# Altium footprint library Elettronica FM.PcbLib: 387 footprints (part 19 of 25)
Each footprint in its own frame and in the unit in brackets; x right, y up, seen from the top. Pads: shape width x height; smd on the part's side, far side on the other; paste and mask are expansions set on the pad; w line width, h text height; cw(c..) or ccw(c..) is an arc to the next point about the centre after c.
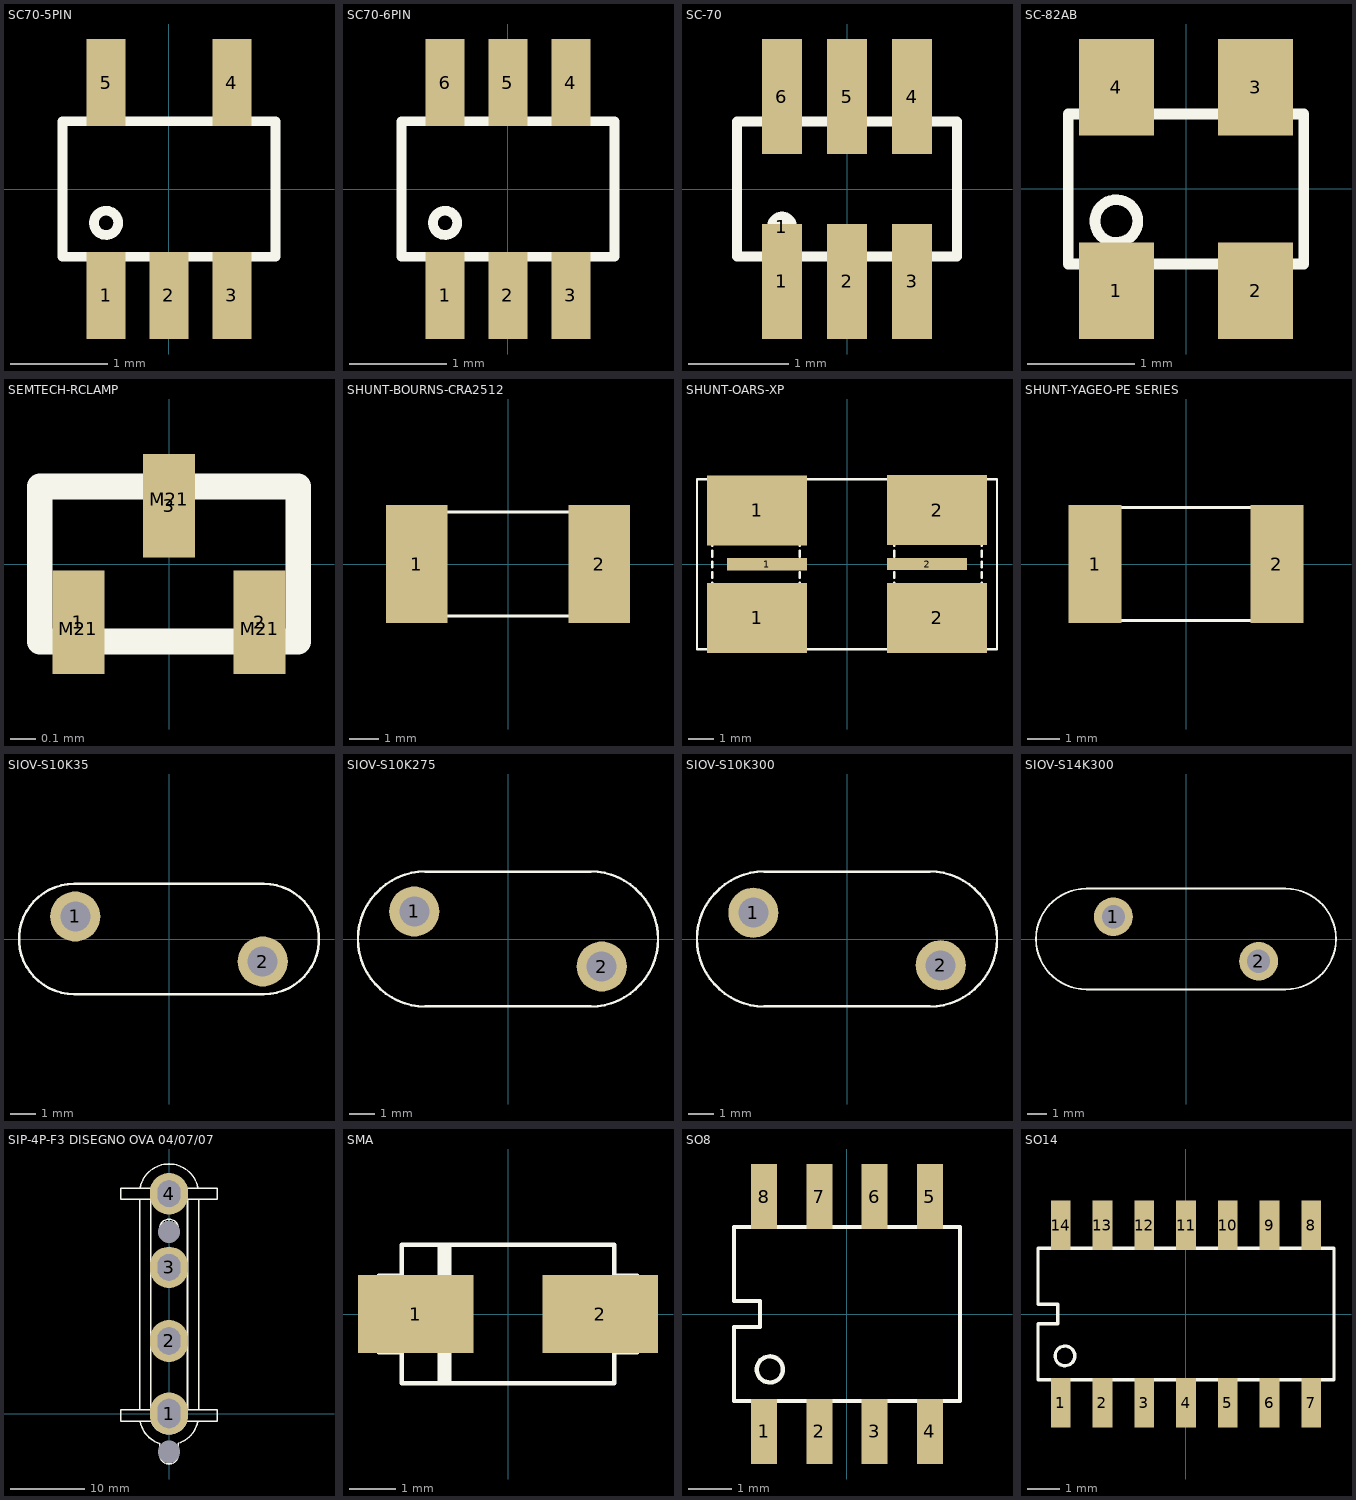
[diagram p18: the footprints below, top view; thin cyan lines are the x and y axes]

## SC70-5PIN [mm]
height 1.7
pads (5):
  rect 0.4x0.9 smd paste-1: 1(-0.65,-1.1) 2(0,-1.1) 3(0.65,-1.1) 4(0.65,1.1) 5(-0.65,1.1)
Top Overlay:
  circle w0.1: c-0.65,-0.35 r0.125
  lines w0.1: -1.1,-0.7 -1.1,0.7 1.1,0.7 1.1,-0.7 -1.1,-0.7
Top Paste:
  region: 0.475,-0.675 0.475,-1.525 0.825,-1.525 0.825,-0.675
  region: -0.175,-0.675 -0.175,-1.525 0.175,-1.525 0.175,-0.675
  region: -0.825,-0.675 -0.825,-1.525 -0.475,-1.525 -0.475,-0.675
  region: 0.475,1.525 0.475,0.675 0.825,0.675 0.825,1.525
  region: -0.825,1.525 -0.825,0.675 -0.475,0.675 -0.475,1.525
3D body "SC70-6 (SOT363).stp": height 0.95, standoff 0, extent -1,-1.05 1,1.05

## SC70-6PIN [mm]
height 1.7
pads (6):
  rect 0.4x0.9 smd paste-1: 1(-0.65,-1.1) 2(0,-1.1) 3(0.65,-1.1) 4(0.65,1.1) 5(0,1.1) 6(-0.65,1.1)
Top Overlay:
  circle w0.1: c-0.65,-0.35 r0.125
  lines w0.1: -1.1,-0.7 1.1,-0.7 1.1,0.7 -1.1,0.7 -1.1,-0.7
Top Paste:
  region: -0.825,1.525 -0.825,0.675 -0.475,0.675 -0.475,1.525
  region: -0.175,1.525 -0.175,0.675 0.175,0.675 0.175,1.525
  region: 0.475,1.525 0.475,0.675 0.825,0.675 0.825,1.525
  region: -0.825,-0.675 -0.825,-1.525 -0.475,-1.525 -0.475,-0.675
  region: -0.175,-0.675 -0.175,-1.525 0.175,-1.525 0.175,-0.675
  region: 0.475,-0.675 0.475,-1.525 0.825,-1.525 0.825,-0.675
3D body "SC70-6 (SOT363).stp": height 0.95, standoff 0, extent -1,-1.05 1,1.05

## SC-70 [mm]
height 1.9
pads (7):
  rect 0.4x1.15 smd mask+0.075: 1(-0.65,-0.925) 2(0,-0.925) 3(0.65,-0.925) 4(0.65,0.925) 5(0,0.925) 6(-0.65,0.925)
  round 0.3 on Top Overlay mask+0.1: 1(-0.65,-0.375)
Top Overlay:
  lines w0.1: -1.1,-0.675 1.1,-0.675 1.1,0.675 -1.1,0.675 -1.1,-0.675

## SC-82AB [mm]
height 1.7
pads (4):
  rect 0.7x0.9 smd: 1(-0.65,-0.95) 2(0.65,-0.95) 3(0.65,0.95) 4(-0.65,0.95)
Top Overlay:
  circle w0.1: c-0.65,-0.3 r0.2
  lines w0.1: -1.1,-0.7 1.1,-0.7 1.1,0.7 -1.1,0.7 -1.1,-0.7

## SEMTECH-RCLAMP [mm]
height 1.9
pads (6):
  rect 0.2x0.4 smd paste-5 mask+0.05: 1(-0.35,-0.225) 2(0.35,-0.225) 3(0,0.225)
  rect 0.22x0.46 on Top Paste paste+0 mask+0.05: M21(-0.35,-0.25) M21(0,0.25) M21(0.35,-0.25)
Top Overlay:
  lines w0.1: -0.5,-0.3 0.5,-0.3 0.5,0.3 -0.5,0.3 -0.5,-0.3
3D body: height 0.4, standoff 0, extent -0.5,-0.3 0.5,0.3

## SHUNT-BOURNS-CRA2512 [mm]
pads (2):
  rect 2.1x4 smd: 1(-3.1,0) 2(3.1,0)
Top Overlay:
  lines w0.1: -2.275,-1.775 -2.275,1.775 ; 2.275,-1.775 2.275,1.775 ; -3.325,-1.775 -3.325,1.775 3.325,1.775 3.325,-1.775 -3.325,-1.775

## SHUNT-OARS-XP [mm]
height 14.2
pads (6):
  rect 4x2.8 smd mask+0.075: 1(-3.6,2.15) 1(-3.6,-2.15) 2(3.6,-2.15) 2(3.6,2.15)
  rect 3.2x0.5 smd mask+0.075: 1(-3.2,0) 2(3.2,0)
Top Overlay:
  lines w0.1: -5.4,-3.4 -5.4,-3.3 ; -5.4,-3.1 -5.4,-2.875 ; -5.4,-2.675 -5.4,-2.45 ; -5.4,-2.25 -5.4,-2.025 ; -5.4,-1.825 -5.4,-1.6 ; -5.4,-1.4 -5.4,-1.175 ; -5.4,-0.975 -5.4,-0.75 ; -5.4,-0.55 -5.4,-0.325 ; -5.4,-0.125 -5.4,0.1 ; -5.4,0.3 -5.4,0.525 ; -5.4,0.725 -5.4,0.95 ; -5.4,1.15 -5.4,1.375 ; -5.4,1.575 -5.4,1.8 ; -5.4,2 -5.4,2.225 ; -5.4,2.425 -5.4,2.65 ; -5.4,2.85 -5.4,3.075 ; -5.4,3.275 -5.4,3.4 ; -1.9,-3.4 -1.9,-3.3 ; -1.9,-3.1 -1.9,-2.875 ; -1.9,-2.675 -1.9,-2.45 ; -1.9,-2.25 -1.9,-2.025 ; -1.9,-1.825 -1.9,-1.6 ; -1.9,-1.4 -1.9,-1.175 ; -1.9,-0.975 -1.9,-0.75 ; -1.9,-0.55 -1.9,-0.325 ; -1.9,-0.125 -1.9,0.1 ; -1.9,0.3 -1.9,0.525 ; -1.9,0.725 -1.9,0.95 ; -1.9,1.15 -1.9,1.375 ; -1.9,1.575 -1.9,1.8 ; -1.9,2 -1.9,2.225 ; -1.9,2.425 -1.9,2.65 ; -1.9,2.85 -1.9,3.075 ; -1.9,3.275 -1.9,3.4 ; 1.9,-3.4 1.9,-3.3 ; 1.9,-3.1 1.9,-2.875 ; 1.9,-2.675 1.9,-2.45 ; 1.9,-2.25 1.9,-2.025 ; 1.9,-1.825 1.9,-1.6 ; 1.9,-1.4 1.9,-1.175 ; 1.9,-0.975 1.9,-0.75 ; 1.9,-0.55 1.9,-0.325 ; 1.9,-0.125 1.9,0.1 ; 1.9,0.3 1.9,0.525 ; 1.9,0.725 1.9,0.95 ; 1.9,1.15 1.9,1.375 ; 1.9,1.575 1.9,1.8 ; 1.9,2 1.9,2.225 ; 1.9,2.425 1.9,2.65 ; 1.9,2.85 1.9,3.075 ; 1.9,3.275 1.9,3.4 ; 5.4,-3.4 5.4,-3.3 ; 5.4,-3.1 5.4,-2.875 ; 5.4,-2.675 5.4,-2.45 ; 5.4,-2.25 5.4,-2.025 ; 5.4,-1.825 5.4,-1.6 ; 5.4,-1.4 5.4,-1.175 ; 5.4,-0.975 5.4,-0.75 ; 5.4,-0.55 5.4,-0.325 ; 5.4,-0.125 5.4,0.1 ; 5.4,0.3 5.4,0.525 ; 5.4,0.725 5.4,0.95 ; 5.4,1.15 5.4,1.375 ; 5.4,1.575 5.4,1.8 ; 5.4,2 5.4,2.225 ; 5.4,2.425 5.4,2.65 ; 5.4,2.85 5.4,3.075 ; 5.4,3.275 5.4,3.4 ; -6,-3.4 6,-3.4 6,3.4 -6,3.4 -6,-3.4
3D body: height 4.6, standoff 0, extent -6,-3.4 6,3.4

## SHUNT-YAGEO-PE SERIES [mm]
pads (2):
  rect 1.65x3.7 smd: 1(-2.85,0) 2(2.85,0)
Top Overlay:
  lines w0.1: -2.275,-1.775 -2.275,1.775 ; 2.275,-1.775 2.275,1.775 ; -3.325,-1.775 3.325,-1.775 3.325,1.775 -3.325,1.775 -3.325,-1.775

## SIOV-S10K35 [mm]
pads (2):
  round 2 hole 1.2 mask+0.101: 1(-3.75,0.9) 2(3.75,-0.9)
Top Overlay:
  lines w0.1: -3.8,-2.2 cw(c-3.8,0) -3.8,2.2 3.8,2.2 cw(c3.8,0) 3.8,-2.2 -3.8,-2.2
3D body: height 14.5, standoff 2.5, extent -6,-2.2 6,2.2
3D body: height 5, standoff 0, extent 2.95,-1.699 4.55,-0.1
3D body: height 5, standoff 0, extent -4.55,0.101 -2.95,1.7
3D body: height 1.9, standoff -3.1, extent -4.15,0.5 -3.35,1.3
3D body: height 1.9, standoff -3.1, extent 3.35,-1.3 4.15,-0.5

## SIOV-S10K275 [mm]
pads (2):
  round 2 hole 1.2 mask+0.101: 1(-3.75,1.1) 2(3.75,-1.1)
Top Overlay:
  lines w0.1: -3.3,-2.7 cw(c-3.3,0) -3.3,2.7 3.3,2.7 cw(c3.3,0) 3.3,-2.7 -3.3,-2.7
3D body: height 1.9, standoff -3.1, extent 3.35,-1.5 4.15,-0.7
3D body: height 1.9, standoff -3.1, extent -4.15,0.7 -3.35,1.5
3D body: height 5, standoff 0, extent -4.55,0.301 -2.95,1.9
3D body: height 5, standoff 0, extent 2.95,-1.899 4.55,-0.3
3D body: height 15, standoff 3, extent -6,-2.7 6,2.7

## SIOV-S10K300 [mm]
pads (2):
  round 2 hole 1.2 mask+0.101: 1(-3.75,1.05) 2(3.75,-1.05)
Top Overlay:
  lines w0.1: -3.3,-2.7 cw(c-3.3,0) -3.3,2.7 3.3,2.7 cw(c3.3,0) 3.3,-2.7 -3.3,-2.7
3D body: height 1.9, standoff -3.1, extent 3.35,-1.45 4.15,-0.65
3D body: height 1.9, standoff -3.1, extent -4.15,0.65 -3.35,1.45
3D body: height 5, standoff 0, extent -4.55,0.251 -2.95,1.85
3D body: height 5, standoff 0, extent 2.95,-1.849 4.55,-0.25
3D body: height 15, standoff 3, extent -6,-2.7 6,2.7

## SIOV-S14K300 [mm]
pads (2):
  round 2 hole 1.2 mask+0.101: 1(-3.75,1.15) 2(3.75,-1.15)
Top Overlay:
  lines w0.1: -5.15,-2.6 cw(c-5.15,0) -5.15,2.6 5.15,2.6 cw(c5.15,0) 5.15,-2.6 -5.15,-2.6
3D body: height 1.9, standoff -3.1, extent 3.35,-1.55 4.15,-0.75
3D body: height 1.9, standoff -3.1, extent -4.15,0.75 -3.35,1.55
3D body: height 5, standoff 0, extent -4.55,0.351 -2.95,1.95
3D body: height 5, standoff 0, extent 2.95,-1.949 4.55,-0.35
3D body: height 18.5, standoff 3, extent -7.75,-2.6 7.75,2.6

## SIP-4P-F3 DISEGNO OVA 04/07/07 [mm]
pads (6):
  oval 5.2x5.7 hole 3.1 slot 4 at 90 deg: 1(0,0)
  oval 5.2x5.7 hole 3.1 slot 3.7 at 90 deg: 2(0,9.8)
  oval 5.2x5.6 hole 3.1 slot 3.6 at 90 deg: 3(0,19.75) 4(0,29.71)
  round 0 hole 3 unplated: 5(0,24.54) 6(0,-5.18)
Top Overlay:
  circle w0.203: c0,29.725 r2
  circle w0.203: c0,19.725 r2
  circle w0.203: c0,9.725 r2
  circle w0.203: c0,-0.275 r2
  circle w0.203: c0.001,-5.576 r0.384
  circle w0.203: c0.001,25.026 r0.384
  lines w0.203: -3.969,0.475 -3.969,28.975 ; -3.912,-1.108 ccw(c0.001,-0.276) -1.248,-4.076 ; -3.912,30.557 cw(c0.001,29.725) 3.914,30.557 ; -2.499,0.475 -2.499,28.975 ; -2.35,30.579 cw(c-0.001,29.724) 2.348,30.579 ; -2.348,-1.129 ccw(c0.001,-0.274) 2.35,-1.129 ; -1.88,0.475 -6.5,0.475 -6.5,-1.025 -1.829,-1.025 ; -1.88,30.475 -6.5,30.475 -6.5,28.975 -1.829,28.975 ; -1.249,-4.043 -1.249,-4.075 -1.249,-5.276 ccw(c0.001,-5.276) -1.246,-5.361 ; -1.246,-5.36 -1.246,-5.36 ; 1.829,0.475 6.5,0.475 6.5,-1.025 1.88,-1.025 ; 1.829,30.475 6.5,30.475 6.5,28.975 1.88,28.975 ; 2.501,0.475 2.501,28.975 ; 3.914,-1.075 cw(c0.001,-0.243) 1.25,-4.043 ; 4.001,0.475 4.001,28.975 ; -1.246,-5.361 ccw(c0.005,-5.275) -1.24,-5.426 ; -1.24,-5.426 cw(c0.001,-5.576) 1.242,-5.426 ; -1.24,-5.426 ccw(c0.001,-5.576) 1.242,-5.426 ; -1.24,-5.426 ccw(c0.001,-5.276) 1.242,-5.426 ; -1.24,-5.426 -1.24,-5.426 ; -1.24,24.876 ccw(c0.001,25.027) 1.242,24.876 ; -1.24,24.876 cw(c0.001,24.726) 1.242,24.876 ; -1.24,24.876 cw(c0.001,24.726) 1.242,24.876 ; -1.24,24.876 cw(c0.001,25.026) 1.242,24.876 ; -1.24,24.876 -1.24,24.876 ; 1.242,-5.426 ccw(c0.001,-5.276) 1.251,-5.276 ; 1.242,-5.426 1.242,-5.426 ; 1.242,24.876 1.242,24.876 ; 1.251,-5.276 1.251,-4.075 1.251,-4.043 ; 1.251,-5.275 1.251,-4.043

## SMA [mm]
height 1.9
pads (2):
  rect 2.5x1.7 smd: 1(-2,0) 2(2,0)
Top Overlay:
  lines w0.1: -2.3,-0.825 -2.8,-0.825 -2.8,0.825 -2.3,0.825 ; -1.475,-1.5 -1.475,1.5 ; -1.375,-1.5 -1.375,1.5 ; -1.275,-1.5 -1.275,1.5 ; 2.3,-0.825 2.8,-0.825 2.8,0.825 2.3,0.825 ; -2.3,-1.5 -2.3,1.5 2.3,1.5 2.3,-1.5 -2.3,-1.5
3D body: height 2.3, standoff 0, extent -2.3,-1.5 2.3,1.5

## SO8 [mm]
height 1.9
pads (8):
  rect 0.6x1.5 smd paste-0.05: 1(-1.905,-2.7) 2(-0.635,-2.7) 3(0.635,-2.7) 4(1.905,-2.7) 5(1.905,2.7) 6(0.635,2.7) 7(-0.635,2.7) 8(-1.905,2.7)
Top Overlay:
  circle w0.1: c-1.775,-1.275 r0.3
  lines w0.1: -2.6,-2 2.6,-2 2.6,2 -2.6,2 -2.6,0.3 -2,0.3 -2,-0.3 -2.6,-0.3 -2.6,-2
3D body: height 1.8, standoff 0, extent -2.075,-1.573 -1.476,-0.975
3D body: height 1, standoff 0, extent -2.155,-3.1 -1.655,-2
3D body: height 1, standoff 0, extent -0.885,-3.1 -0.385,-2
3D body: height 1, standoff 0, extent 0.385,-3.1 0.885,-2
3D body: height 1, standoff 0, extent 1.655,-3.1 2.155,-2
3D body: height 1, standoff 0, extent 1.655,2 2.155,3.1
3D body: height 1, standoff 0, extent 0.385,2 0.885,3.1
3D body: height 1, standoff 0, extent -2.155,2 -1.655,3.1
3D body: height 1, standoff 0, extent -0.885,2 -0.385,3.1
3D body: height 1.75, standoff 0, extent -2.6,-2 2.6,2

## SO14 [mm]
height 1.9
pads (14):
  rect 0.6x1.5 smd paste-0.102: 1(-3.81,-2.7) 2(-2.54,-2.7) 3(-1.27,-2.7) 4(0,-2.7) 5(1.27,-2.7) 6(2.54,-2.7) 7(3.81,-2.7) 8(3.81,2.7) 9(2.54,2.7) 10(1.27,2.7) 11(0,2.7) 12(-1.27,2.7) 13(-2.54,2.7) 14(-3.81,2.7)
Top Overlay:
  circle w0.1: c-3.68,-1.275 r0.3
  lines w0.1: -4.5,-2 -4.5,-0.3 -3.9,-0.3 -3.9,0.3 -4.5,0.3 -4.5,2 4.5,2 4.5,-2 -4.5,-2
3D body: height 1.75, standoff 0, extent -4.505,-2 4.495,2
3D body: height 1, standoff 0, extent -2.79,2 -2.29,3.1
3D body: height 1, standoff 0, extent -4.06,2 -3.56,3.1
3D body: height 1, standoff 0, extent -1.52,2 -1.02,3.1
3D body: height 1, standoff 0, extent -0.25,2 0.25,3.1
3D body: height 1, standoff 0, extent -0.25,-3.1 0.25,-2
3D body: height 1, standoff 0, extent -1.52,-3.1 -1.02,-2
3D body: height 1, standoff 0, extent -2.79,-3.1 -2.29,-2
3D body: height 1, standoff 0, extent -4.06,-3.1 -3.56,-2
3D body: height 1.8, standoff 0, extent -3.98,-1.573 -3.381,-0.975
3D body: height 1, standoff 0, extent 1.02,-3.1 1.52,-2
3D body: height 1, standoff 0, extent 2.29,-3.1 2.79,-2
3D body: height 1, standoff 0, extent 3.56,-3.1 4.06,-2
3D body: height 1, standoff 0, extent 3.56,2 4.06,3.1
3D body: height 1, standoff 0, extent 2.29,2 2.79,3.1
3D body: height 1, standoff 0, extent 1.02,2 1.52,3.1